# Altium footprint library BuoyLoRaNode.PcbLib: 20 footprints (part 1 of 2)
Each footprint in its own frame and in the unit in brackets; x right, y up, seen from the top. Pads: shape width x height; smd on the part's side, far side on the other; paste and mask are expansions set on the pad; w line width, h text height; cw(c..) or ccw(c..) is an arc to the next point about the centre after c.
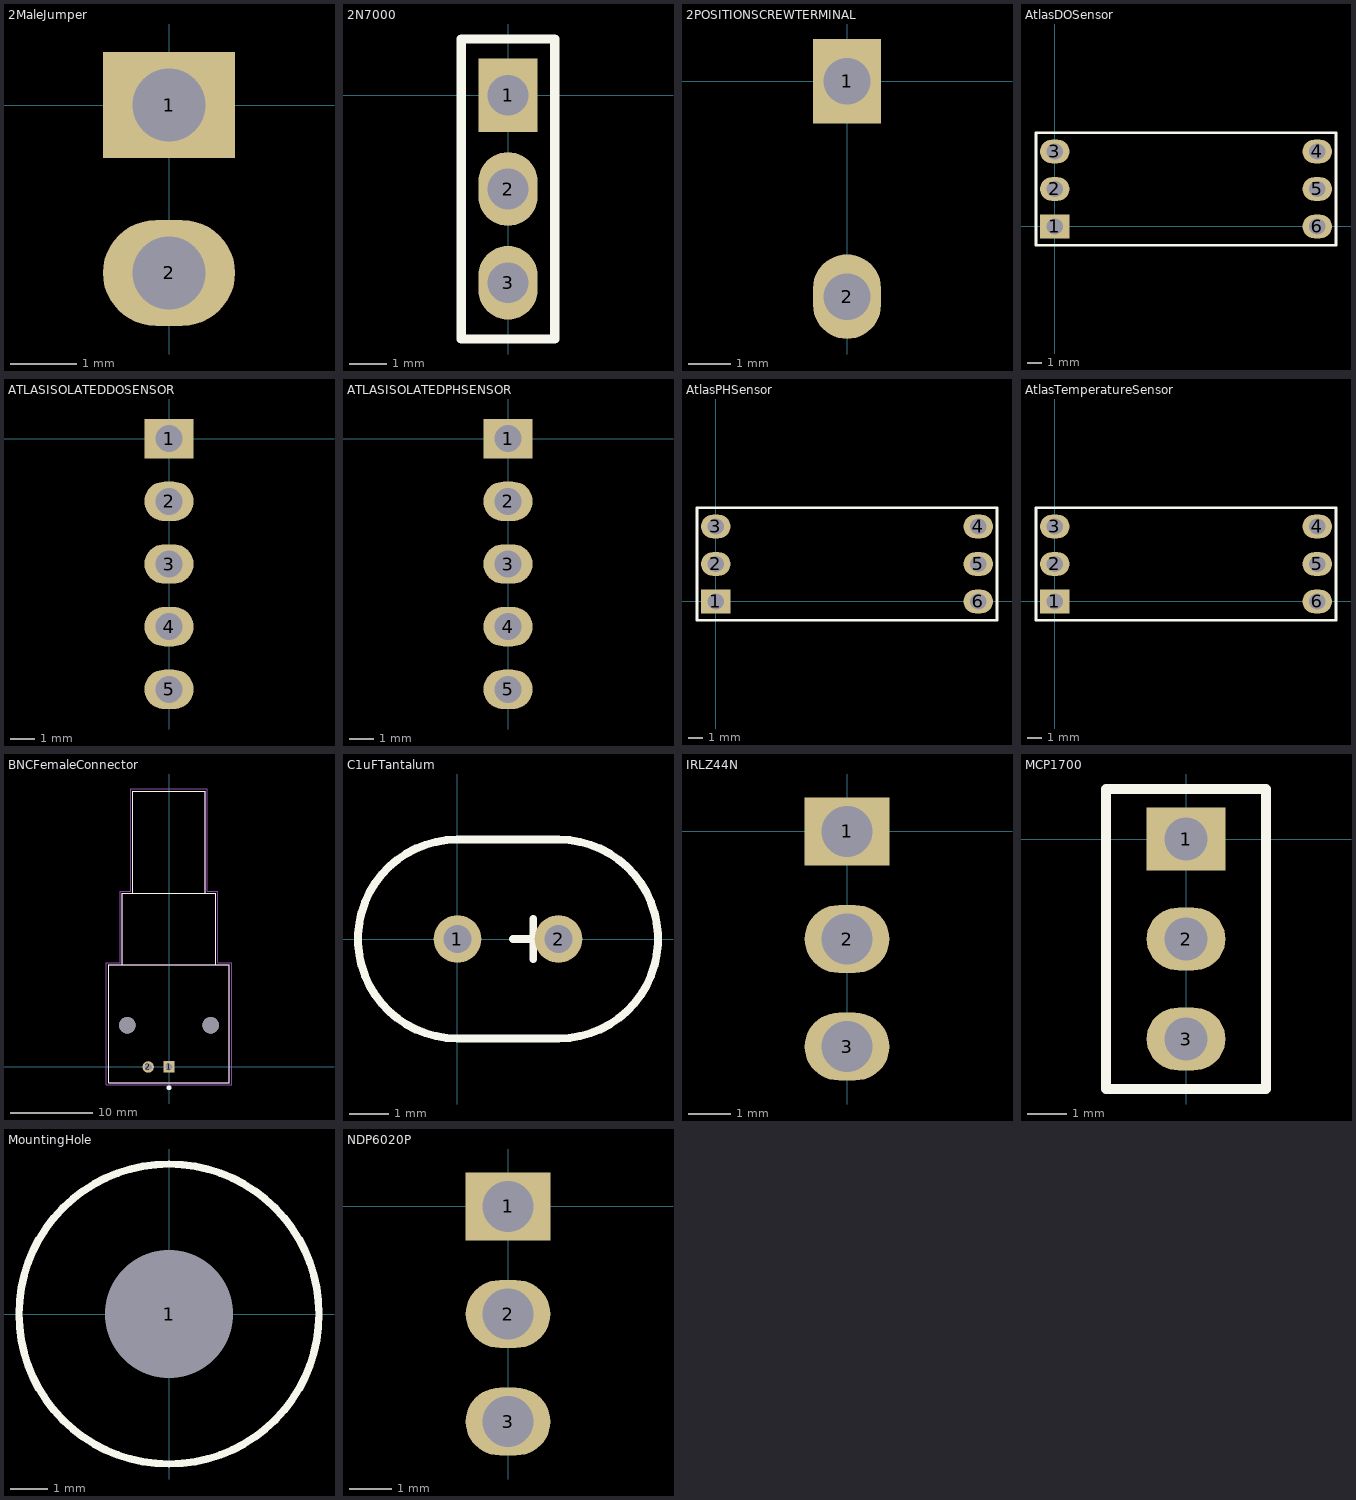
[diagram p0: the footprints below, top view; thin cyan lines are the x and y axes]

## 2MaleJumper [mm]
pads (2):
  rect 2x1.6 hole 1.1: 1(0,0)
  oval 2x1.6 hole 1.1: 2(0,-2.54)
3D body "2PinMaleHeader.stp": height 4.67, standoff -3, extent -1,-3.175 1,0.762

## 2N7000 [mm]
pads (3):
  rect 1.6x2 hole 1.1: 1(0,0)
  oval 1.6x2 hole 1.1: 2(0,-2.54) 3(0,-5.08)
Top Overlay:
  lines w0.254: -1.27,-6.604 -1.27,1.524 1.27,1.524 1.27,-6.604 -1.27,-6.604
3D body "2N7000.STEP": height 9.7, standoff -2.7, extent -1.898,-5.338 2.032,0.258

## 2POSITIONSCREWTERMINAL [mm]
pads (2):
  rect 1.6x2 hole 1.1: 1(0,0)
  oval 1.6x2 hole 1.1: 2(0,-5.08)
3D body "2PositionScrewTerminal0.2mmPitch.step": height 11, standoff -2.8, extent -4.136,-8.1 4.064,2.56

## AABatteryHolder [mm]
3D body "BCAAL-SINGLE AA BATHOLDER.SLDPRT": height 14.54, standoff 0, extent -8.128,-30.891 8.128,30.891

## AtlasDOSensor [mm]
pads (6):
  rect 2x1.6 hole 1.1: 1(0,0)
  oval 2x1.6 hole 1.1: 2(0,2.54) 3(0,5.08) 4(17.78,5.08) 5(17.78,2.54) 6(17.78,0)
Top Overlay:
  lines w0.2: -1.27,-1.27 -1.27,0.635 -1.27,4.445 -1.27,6.35 19.05,6.35 19.05,-1.27 8.255,-1.27 -1.27,-1.27
3D body "m20-7820346_asm.stp": height 8.51, standoff -2.99, extent 16.53,-1.47 19.03,6.55
3D body "m20-7820346_asm.stp": height 8.51, standoff -2.99, extent -1.25,-1.47 1.25,6.55
3D body "EZO-DO.step": height 14.25, standoff 2.71, extent -1.27,-4.572 19,9.398

## ATLASISOLATEDDOSENSOR [mm]
pads (5):
  rect 2x1.6 hole 1.1: 1(0,0)
  oval 2x1.6 hole 1.1: 2(0,-2.54) 3(0,-5.08) 4(0,-7.62) 5(0,-10.16)
3D body "EZO-DO.step": height 17.3, standoff 5.76, extent 5.811,-11.874 26.081,2.096
3D body "AtlasScientificElectricallyIsolatedCarrierBoard v31.step": height 14.02, standoff -7.67, extent -5,-20.826 46.541,11.174

## ATLASISOLATEDPHSENSOR [mm]
pads (5):
  rect 2x1.6 hole 1.1: 1(0,0)
  oval 2x1.6 hole 1.1: 2(0,-2.54) 3(0,-5.08) 4(0,-7.62) 5(0,-10.16)
3D body "EZO-pH.step": height 17.3, standoff 5.76, extent 5.842,-11.974 26.137,1.996
3D body "AtlasScientificElectricallyIsolatedCarrierBoard v31.step": height 14.02, standoff -7.67, extent -5,-20.826 46.541,11.174

## AtlasIsolatedSensor [mm]

## AtlasPHSensor [mm]
pads (6):
  rect 2x1.6 hole 1.1: 1(0,0)
  oval 2x1.6 hole 1.1: 2(0,2.54) 3(0,5.08) 4(17.78,5.08) 5(17.78,2.54) 6(17.78,0)
Top Overlay:
  lines w0.2: -1.27,-1.27 -1.27,0.635 -1.27,4.445 -1.27,6.35 19.05,6.35 19.05,-1.27 8.255,-1.27 -1.27,-1.27
3D body "EZO-pH.step": height 14.25, standoff 2.71, extent -1.27,-4.572 19.025,9.398
3D body "m20-7820346_asm.stp": height 8.51, standoff -2.99, extent 16.53,-1.47 19.03,6.55
3D body "m20-7820346_asm.stp": height 8.51, standoff -2.99, extent -1.25,-1.47 1.25,6.55

## AtlasTemperatureSensor [mm]
pads (6):
  rect 2x1.6 hole 1.1: 1(0,0)
  oval 2x1.6 hole 1.1: 2(0,2.54) 3(0,5.08) 4(17.78,5.08) 5(17.78,2.54) 6(17.78,0)
Top Overlay:
  lines w0.2: -1.27,-1.27 -1.27,0.635 -1.27,4.445 -1.27,6.35 19.05,6.35 19.05,-1.27 8.255,-1.27 -1.27,-1.27
3D body "m20-7820346_asm.stp": height 8.51, standoff -2.99, extent 16.53,-1.47 19.03,6.55
3D body "m20-7820346_asm.stp": height 8.51, standoff -2.99, extent -1.25,-1.47 1.25,6.55
3D body "EZO-RTD.step": height 14.25, standoff 2.71, extent -1.245,-4.644 19.025,9.326

## BNCFemaleConnector [mm]
pads (4):
  rect 1.398x1.398 hole 0.89: 1(0,0)
  round 1.398 hole 0.89: 2(-2.54,0)
  round 2.01 hole 2.01 unplated: ""(-5.08,5.08) ""(5.08,5.08)
Top Overlay:
  circle w0.3: c0,-2.54 r0.15
  lines w0.127: -5.715,12.45 -5.715,21.21 -4.445,21.21 ; 5.715,12.45 5.715,21.21 4.445,21.21 ; -4.445,21.21 4.445,21.21 ; -4.445,21.21 -4.445,33.66 4.445,33.66 4.445,21.21 ; -7.38,-1.9 -7.38,12.45 7.38,12.45 7.38,-1.9 -7.38,-1.9
Mechanical 13:
  circle w0.3: c0,0 r0.15
  lines w0.127: -5.715,12.45 -7.38,12.45 -7.38,-1.9 7.38,-1.9 7.38,12.45 5.715,12.45 ; -5.715,12.45 5.715,12.45 ; -5.715,12.45 -5.715,21.21 -4.445,21.21 ; -4.445,21.21 4.445,21.21 ; -4.445,21.21 -4.445,33.66 4.445,33.66 4.445,21.21 ; 4.445,21.21 5.715,21.21 5.715,12.45
  text "PCB EDGE" at -4.002,21.308 h1.27
Mechanical 15:
  lines w0.05: -7.63,-2.15 7.63,-2.15 7.63,12.7 5.965,12.7 5.965,21.46 4.695,21.46 4.695,33.91 -4.695,33.91 -4.695,21.46 -5.965,21.46 -5.965,12.7 -7.63,12.7 -7.63,-2.15
3D body "FemaleBNCConnector.stp": height 17.32, standoff -2.67, extent -7.379,-1.9 7.379,33.66

## C1uFTantalum [mm]
pads (2):
  round 1.2 hole 0.7: 1(0,0) 2(2.54,0)
Top Overlay:
  lines w0.2: 1.397,0 2.413,0 ; 1.905,-0.508 1.905,0.508 ; 0,-2.5 cw(c0,0) 0,2.5 2.54,2.5 cw(c2.54,0) 2.54,-2.5 0,-2.5
3D body "1uFTantalumCapacitor.step": height 8.1, standoff -12.96, extent -0.98,-2.25 3.52,2.25

## IRLZ44N [mm]
pads (3):
  rect 2x1.6 hole 1.2: 1(0,0)
  oval 2x1.6 hole 1.2: 2(0,-2.54) 3(0,-5.08)
3D body "PG-TO220-3_INF.step": height 19.3, standoff -3.99, extent -1.575,-7.645 2.819,2.565

## MCP1700 [mm]
pads (3):
  rect 2x1.6 hole 1.1: 1(0,0)
  oval 2x1.6 hole 1.1: 2(0,-2.54) 3(0,-5.08)
Top Overlay:
  lines w0.254: -2.032,-6.35 -2.032,1.27 2.032,1.27 2.032,-6.35 -2.032,-6.35
3D body "MCP1700.STEP": height 10.2, standoff -2.2, extent -1.898,-5.338 2.032,0.258

## MountingHole [mm]
pads (1):
  round 3.4 hole 3.4 unplated: 1(0,0)
Top Overlay:
  circle w0.2: c0,0 r4

## NDP6020P [mm]
pads (3):
  rect 2x1.6 hole 1.2: 1(0,0)
  oval 2x1.6 hole 1.2: 2(0,-2.54) 3(0,-5.08)
3D body "3PinFemaleHeader.stp": height 9, standoff -2.5, extent -1.25,-6.55 1.25,1.47
3D body "PG-TO220-3_INF.step": height 27.3, standoff 4.01, extent -1.575,-7.645 2.819,2.565